# Altium footprint library UltraZOhm_CarrierBoard.PcbLib: 123 footprints (part 4 of 8)
Each footprint in its own frame and in the unit in brackets; x right, y up, seen from the top. Pads: shape width x height; smd on the part's side, far side on the other; paste and mask are expansions set on the pad; w line width, h text height; cw(c..) or ccw(c..) is an arc to the next point about the centre after c.
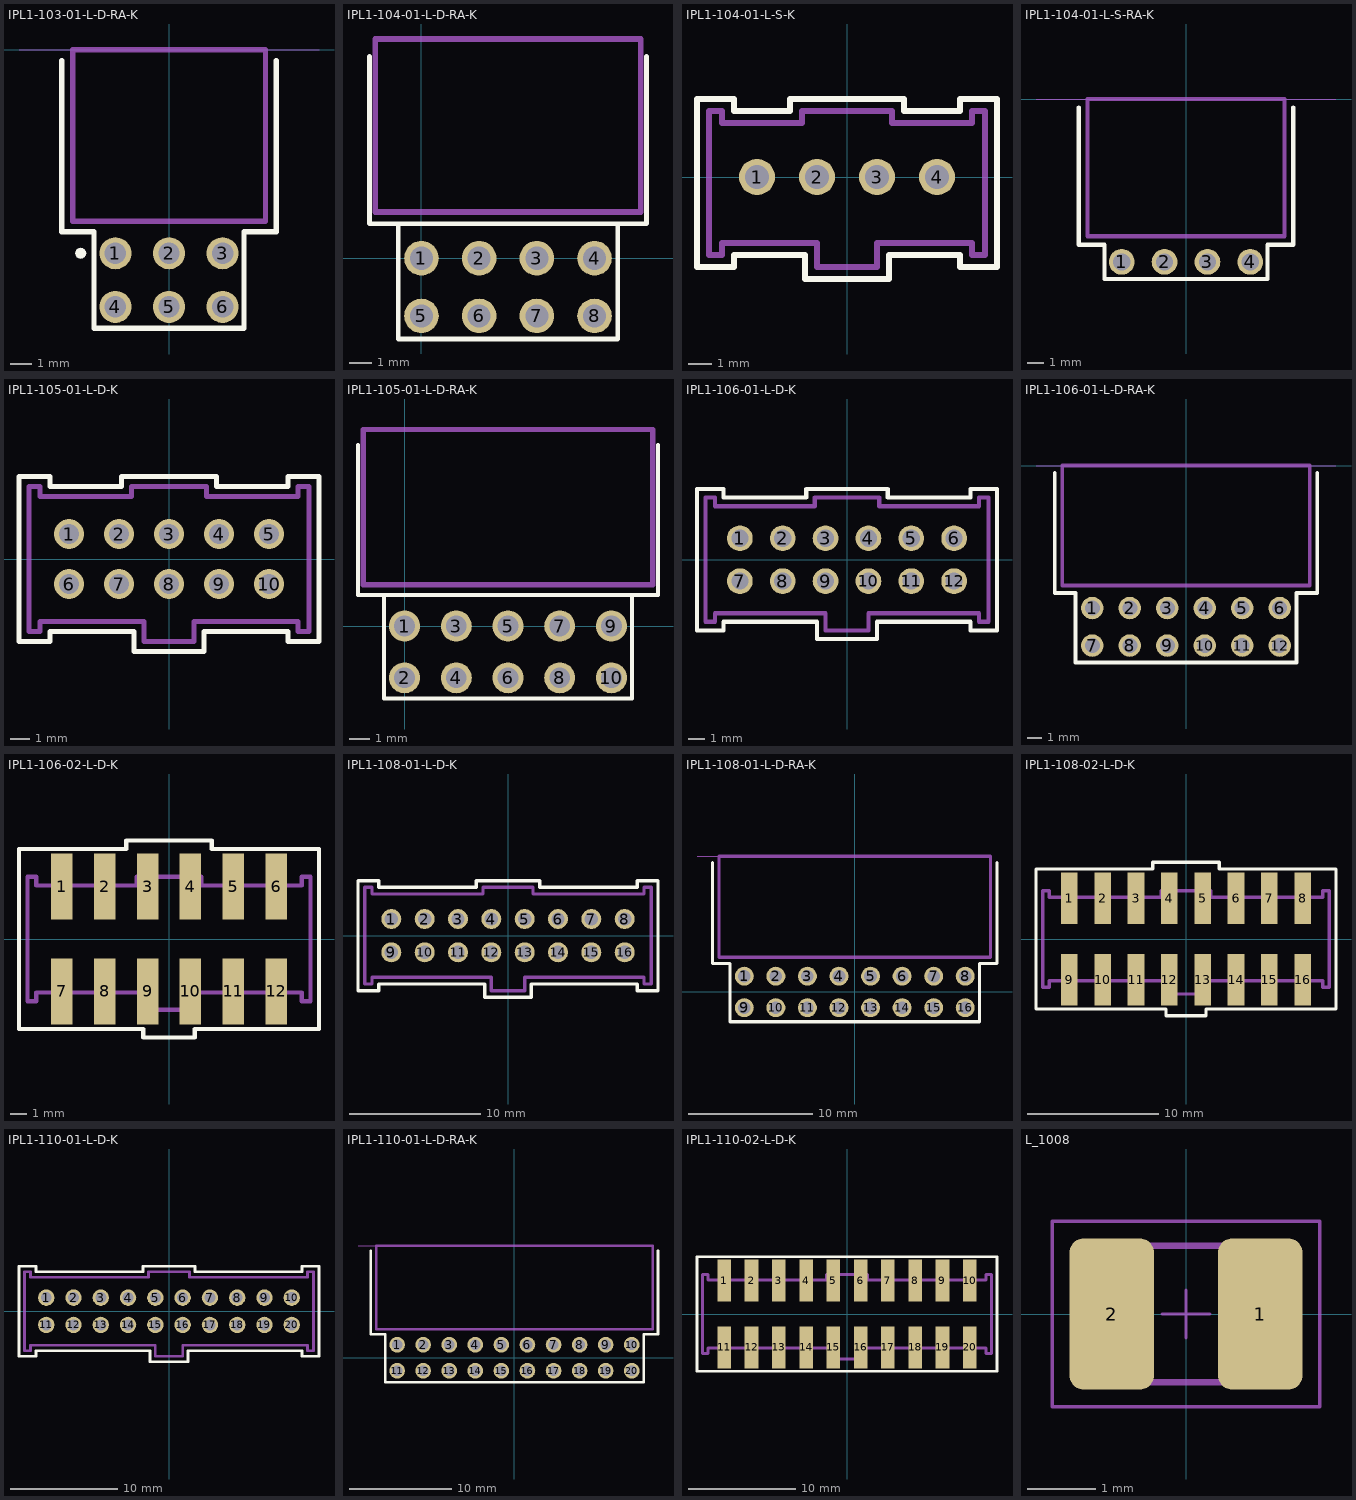
[diagram p3: the footprints below, top view; thin cyan lines are the x and y axes]

## IPL1-103-01-L-D-RA-K [mil]
pads (6):
  round 60 hole 40 mask+3: 1(-100,-380) 2(0,-380) 3(100,-380) 4(-100,-480) 5(0,-480) 6(100,-480)
Top Overlay:
  region: -154.8,-380 -155.58,-376.1 -157.79,-372.79 -161.1,-370.58 -165,-369.8 -168.9,-370.58 -172.21,-372.79 -174.42,-376.1 -175.2,-380 -174.42,-383.9 -172.21,-387.21 -168.9,-389.42 -165,-390.2 -161.1,-389.42 -157.79,-387.21 -155.58,-383.9
  lines w10: -200,-20 -200,-340 -140,-340 -140,-520 140,-520 140,-340 200,-340 200,-20
M5 Assembly Top:
  lines w10: -180,-320 180,-320 180,0 -180,0 -180,-320
  text ".Designator" at -106.3,-263.78 h60
Mechanical 16:
  lines w0.1: -280,0 280,0
3D body "IPL1-103-01-L-D-RA-K.stp": height 310, standoff -85, extent -179.99,-492.49 180.01,0.01

## IPL1-104-01-L-D-RA-K [mil]
pads (8):
  round 60 hole 40: 1(0,0) 2(100,0) 3(200,0) 4(300,0) 5(0,-100) 6(100,-100) 7(200,-100) 8(300,-100)
Top Overlay:
  lines w8: -90,350 -90,60 390,60 390,350 ; -40,60 -40,-140 340,-140 340,60
M5 Assembly Top:
  lines w10: -80,80 380,80 380,380 -80,380 -80,80
  text ".Designator" at 47.24,125.98 h60
3D body "IPL1-104-01-L-D-RA-K.stp": height 315, standoff -80, extent -79.49,-112.24 380.51,380.26

## IPL1-104-01-L-S-K [mil]
pads (4):
  round 60 hole 40 mask+3: 1(-150,0) 2(-50,0) 3(50,0) 4(150,0)
Top Overlay:
  lines w10: -250,-150 -188,-150 -188,-130 -70,-130 -70,-170 70,-170 70,-130 188,-130 188,-150 250,-150 250,130 188,130 188,110 95,110 95,130 -95,130 -95,110 -188,110 -188,130 -250,130 -250,-150
M5 Assembly Top:
  lines w10: -230,-130 -208,-130 -208,-110 -50,-110 -50,-150 50,-150 50,-110 208,-110 208,-130 230,-130 230,110 208,110 208,90 75,90 75,110 -75,110 -75,90 -208,90 -208,110 -230,110 -230,-130
  text ".Designator" at -94.49,-55.12 h60
3D body "IPL1-104-01-L-S-K.stp": height 320, standoff -120, extent -230,-150 230,110

## IPL1-104-01-L-S-RA-K [mil]
pads (4):
  round 60 hole 40 mask+3: 1(-150,-380) 2(-50,-380) 3(50,-380) 4(150,-380)
Top Overlay:
  lines w10: -250,-20 -250,-340 -190,-340 -190,-420 190,-420 190,-340 250,-340 250,-20
M5 Assembly Top:
  lines w10: -230,-320 230,-320 230,0 -230,0 -230,-320
  text ".Designator" at -118.11,-240.16 h60
Mechanical 16:
  lines w0.01: -350,0 350,0
3D body "IPL1-104-01-L-S-RA-K.stp": height 260, standoff -85, extent -229.99,-392.49 230.01,0.01

## IPL1-105-01-L-D-K [mil]
pads (10):
  round 60 hole 40 mask+3: 1(-200,50) 2(-100,50) 3(0,50) 4(100,50) 5(200,50) 6(-200,-50) 7(-100,-50) 8(0,-50) 9(100,-50) 10(200,-50)
Top Overlay:
  lines w10: -300,-165 -300,165 -238,165 -238,145 -95,145 -95,165 95,165 95,145 238,145 238,165 300,165 300,-165 238,-165 238,-145 70,-145 70,-185 -70,-185 -70,-145 -238,-145 -238,-165 -300,-165
M5 Assembly Top:
  lines w10: -280,-145 -280,145 -258,145 -258,125 -75,125 -75,145 75,145 75,125 258,125 258,145 280,145 280,-145 258,-145 258,-125 50,-125 50,-165 -50,-165 -50,-125 -258,-125 -258,-145 -280,-145
  text ".Designator" at -106.3,-39.37 h60
3D body "IPL1-105-01-F-D-K.stp": height 320, standoff -120, extent -279.99,-165 280.01,145

## IPL1-105-01-L-D-RA-K [mil]
pads (10):
  round 60 hole 40: 1(0,0) 2(0,-100) 3(100,0) 4(100,-100) 5(200,0) 6(200,-100) 7(300,0) 8(300,-100) 9(400,0) 10(400,-100)
Top Overlay:
  lines w8: -90,350 -90,60 490,60 490,350 ; -40,60 -40,-140 440,-140 440,60
M5 Assembly Top:
  lines w10: -80,80 -79.99,380.01 480,380 480,80 -80,80
  text ".Designator" at 114.17,153.54 h60
3D body "IPL1-105-01-L-D-RA-K.stp": height 315, standoff -80, extent -79.99,-112.49 480.01,380.01

## IPL1-106-01-L-D-K [mil]
pads (12):
  round 60 hole 40 mask+3: 1(-250,50) 2(-150,50) 3(-50,50) 4(50,50) 5(150,50) 6(250,50) 7(-250,-50) 8(-150,-50) 9(-50,-50) 10(50,-50) 11(150,-50) 12(250,-50)
Top Overlay:
  lines w10: -350,-165 -350,165 -288,165 -288,145 -95,145 -95,165 95,165 95,145 288,145 288,165 350,165 350,-165 288,-165 288,-145 70,-145 70,-185 -70,-185 -70,-145 -288,-145 -288,-165 -350,-165
M5 Assembly Top:
  lines w10: -330,-145 -330,145 -308,145 -308,125 -75,125 -75,145 75,145 75,125 308,125 308,145 330,145 330,-145 308,-145 308,-125 50,-125 50,-165 -50,-165 -50,-125 -308,-125 -308,-145 -330,-145
  text ".Designator" at -98.43,-27.56 h60
3D body "IPL1-106-01-L-D-K.stp": height 320, standoff -120, extent -330,-165 330,145

## IPL1-106-01-L-D-RA-K [mil]
pads (12):
  round 60 hole 40 mask+3: 1(-250,-380) 2(-150,-380) 3(-50,-380) 4(50,-380) 5(150,-380) 6(250,-380) 7(-250,-480) 8(-150,-480) 9(-50,-480) 10(50,-480) 11(150,-480) 12(250,-480)
Top Overlay:
  lines w10: -350,-20 -350,-340 -295,-340 -295,-525 295,-525 295,-340 350,-340 350,-20
M5 Assembly Top:
  lines w10: -330,-320 330,-320 330,0 -330,0 -330,-320
  text ".Designator" at -74.8,-251.97 h60
Mechanical 16:
  lines w0.1: -400,0 400,0
3D body "IPL1-106-01-L-D-RA-K.stp": height 310, standoff -85, extent -329.99,-492.49 330.01,0.01

## IPL1-106-02-L-D-K [mil]
pads (12):
  rect 50x155 smd mask+2: 1(-250,122.5) 2(-150,122.5) 3(-50,122.5) 4(50,122.5) 5(150,122.5) 6(250,122.5) 7(-250,-122.5) 8(-150,-122.5) 9(-50,-122.5) 10(50,-122.5) 11(150,-122.5) 12(250,-122.5)
Top Overlay:
  lines w10: -350,-210 -60,-210 -60,-230 60,-230 60,-210 350,-210 350,210 100,210 100,230 -100,230 -100,210 -350,210 -350,-210
M5 Assembly Top:
  lines w10: -330,-145 -310,-145 -310,-125 -50,-125 -50,-165 50,-165 50,-125 310,-125 310,-145 330,-145 330,145 310,145 310,125 75,125 75,145 -75,145 -75,125 -310,125 -310,145 -330,145 -330,-145
  text ".Designator" at -55.12,-35.43 h60
3D body "IPL1-106-02-L-D-K.stp": height 320, standoff -25, extent -330,-188.5 330,188.5

## IPL1-108-01-L-D-K [mil]
pads (16):
  round 60 hole 40 mask+3: 1(-350,50) 2(-250,50) 3(-150,50) 4(-50,50) 5(50,50) 6(150,50) 7(250,50) 8(350,50) 9(-350,-50) 10(-250,-50) 11(-150,-50) 12(-50,-50) 13(50,-50) 14(150,-50) 15(250,-50) 16(350,-50)
Top Overlay:
  lines w10: -450,-165 -450,165 -388,165 -388,145 -95,145 -95,165 95,165 95,145 388,145 388,165 450,165 450,-165 388,-165 388,-145 70,-145 70,-185 -70,-185 -70,-145 -388,-145 -388,-165 -450,-165
M5 Assembly Top:
  lines w10: -430,-145 -430,145 -408,145 -408,125 -75,125 -75,145 75,145 75,125 408,125 408,145 430,145 430,-145 408,-145 408,-125 50,-125 50,-165 -50,-165 -50,-125 -408,-125 -408,-145 -430,-145
  text ".Designator" at -70.87,-27.56 h60
3D body "IPL1-108-01-L-D-K.stp": height 320, standoff -120, extent -430,-165 430,145

## IPL1-108-01-L-D-RA-K [mil]
pads (16):
  round 60 hole 40 mask+3: 1(-350,50) 2(-250,50) 3(-150,50) 4(-50,50) 5(50,50) 6(150,50) 7(250,50) 8(350,50) 9(-350,-50) 10(-250,-50) 11(-150,-50) 12(-50,-50) 13(50,-50) 14(150,-50) 15(250,-50) 16(350,-50)
Top Overlay:
  lines w10: -450.79,410 -450.79,90.55 -395.79,90.55 -395.79,-94.49 395.79,-94.49 395.79,90 450.79,90 450.79,410
M5 Assembly Top:
  lines w10: -430,110 430,110 430,430 -430,430 -430,110
  text ".Designator" at -82.68,173.23 h60
Mechanical 16:
  lines w0.1: -500,430 300,430
3D body "IPL1-108-01-F-D-RA-K.stp": height 310, standoff -85, extent -430,-58.32 430,434.18

## IPL1-108-02-L-D-K [mil]
pads (16):
  rect 50x155 smd mask+2: 1(-350,122.5) 2(-250,122.5) 3(-150,122.5) 4(-50,122.5) 5(50,122.5) 6(150,122.5) 7(250,122.5) 8(350,122.5) 9(-350,-122.5) 10(-250,-122.5) 11(-150,-122.5) 12(-50,-122.5) 13(50,-122.5) 14(150,-122.5) 15(250,-122.5) 16(350,-122.5)
Top Overlay:
  lines w10: -450,-210 -450,210 -100,210 -100,230 100,230 100,210 450,210 450,-210 60,-210 60,-230 -60,-230 -60,-210 -450,-210
M5 Assembly Top:
  lines w10: -430,-145 -410,-145 -410,-125 -50,-125 -50,-165 50,-165 50,-125 410,-125 410,-145 430,-145 430,145 410,145 410,125 75,125 75,145 -75,145 -75,125 -410,125 -410,145 -430,145 -430,-145
  text ".Designator" at -51.18,-43.31 h60
3D body "IPL1-108-02-L-D-K.stp": height 320, standoff -25, extent -430,-188.5 430,188.5

## IPL1-110-01-L-D-K [mil]
pads (20):
  round 60 hole 40 mask+3: 1(-450,50) 2(-350,50) 3(-250,50) 4(-150,50) 5(-50,50) 6(50,50) 7(150,50) 8(250,50) 9(350,50) 10(450,50) 11(-450,-50) 12(-350,-50) 13(-250,-50) 14(-150,-50) 15(-50,-50) 16(50,-50) 17(150,-50) 18(250,-50) 19(350,-50) 20(450,-50)
Top Overlay:
  lines w10: -550,-165 -488,-165 -488,-145 -70,-145 -70,-185 70,-185 70,-145 488,-145 488,-165 550,-165 550,165 488,165 488,145 95,145 95,165 -95,165 -95,145 -488,145 -488,165 -550,165 -550,-165
M5 Assembly Top:
  lines w10: -530,-145 -508,-145 -508,-125 -50,-125 -50,-165 50,-165 50,-125 508,-125 508,-145 530,-145 530,145 508,145 508,125 75,125 75,145 -75,145 -75,125 -508,125 -508,145 -530,145 -530,-145
  text ".Designator" at -78.74,-39.37 h60
3D body "IPL1-110-01-L-D-K.stp": height 320, standoff -120, extent -530,-165 530,145

## IPL1-110-01-L-D-RA-K [mil]
pads (20):
  round 60 hole 40 mask+3: 1(-450,50) 2(-350,50) 3(-250,50) 4(-150,50) 5(-50,50) 6(50,50) 7(150,50) 8(250,50) 9(350,50) 10(450,50) 11(-450,-50) 12(-350,-50) 13(-250,-50) 14(-150,-50) 15(-50,-50) 16(50,-50) 17(150,-50) 18(250,-50) 19(350,-50) 20(450,-50)
Top Overlay:
  lines w10: -550.79,410 -550.79,90.55 -495.79,90.55 -495.79,-94.49 495.79,-94.49 495.79,90 550.79,90 550.79,410
M5 Assembly Top:
  lines w10: -530,110 -530,430 530,430 530,110 -530,110
  text ".Designator" at -66.93,185.04 h60
Mechanical 16:
  lines w0.1: -600,430 200,430
3D body "IPL1-110-01-L-D-RA-K.stp": height 165, standoff -230, extent -530,-62.5 530,430

## IPL1-110-02-L-D-K [mil]
pads (20):
  rect 50x155 smd mask+2: 1(-450,122.5) 2(-350,122.5) 3(-250,122.5) 4(-150,122.5) 5(-50,122.5) 6(50,122.5) 7(150,122.5) 8(250,122.5) 9(350,122.5) 10(450,122.5) 11(-450,-122.5) 12(-350,-122.5) 13(-250,-122.5) 14(-150,-122.5) 15(-50,-122.5) 16(50,-122.5) 17(150,-122.5) 18(250,-122.5) 19(350,-122.5) 20(450,-122.5)
Top Overlay:
  lines w10: -550,-210 550,-210 550,210 -550,210 -550,-210
M5 Assembly Top:
  lines w10: -530,-145 -510,-145 -510,-125 -50,-125 -50,-165 50,-165 50,-125 510,-125 510,-145 530,-145 530,145 510,145 510,125 75,125 75,145 -75,145 -75,125 -510,125 -510,145 -530,145 -530,-145
  text ".Designator" at -59.06,-43.31 h60
3D body "IPL1-110-02-F-D-K.stp": height 345, standoff 0, extent -530,-188.49 530,188.51

## L_1008 [mm]
height 1
pads (2):
  rrect33% 1.24x2.22 smd: 1(1.09,0) 2(-1.09,0)
M5 Assembly Top:
  lines w0.1: -0.65,-1 -0.65,1 ; 0.65,-1 0.65,1 ; -1.25,-1 1.25,-1 1.25,1 -1.25,1 -1.25,-1
  text ".Designator" at -0.5,-0.5 h0.76
Mechanical 15:
  lines w0.05: -0.35,0 0.35,0 ; 0,-0.35 0,0.35 ; -1.96,-1.36 1.96,-1.36 1.96,1.36 -1.96,1.36 -1.96,-1.36
3D body "LQM2HP_G0.stp": height 0.9, standoff 0, extent -1.25,-1 1.25,1